# Altium footprint library Miscellaneous Devices.PcbLib: 291 footprints (part 7 of 19)
Each footprint in its own frame and in the unit in brackets; x right, y up, seen from the top. Pads: shape width x height; smd on the part's side, far side on the other; paste and mask are expansions set on the pad; w line width, h text height; cw(c..) or ccw(c..) is an arc to the next point about the centre after c.
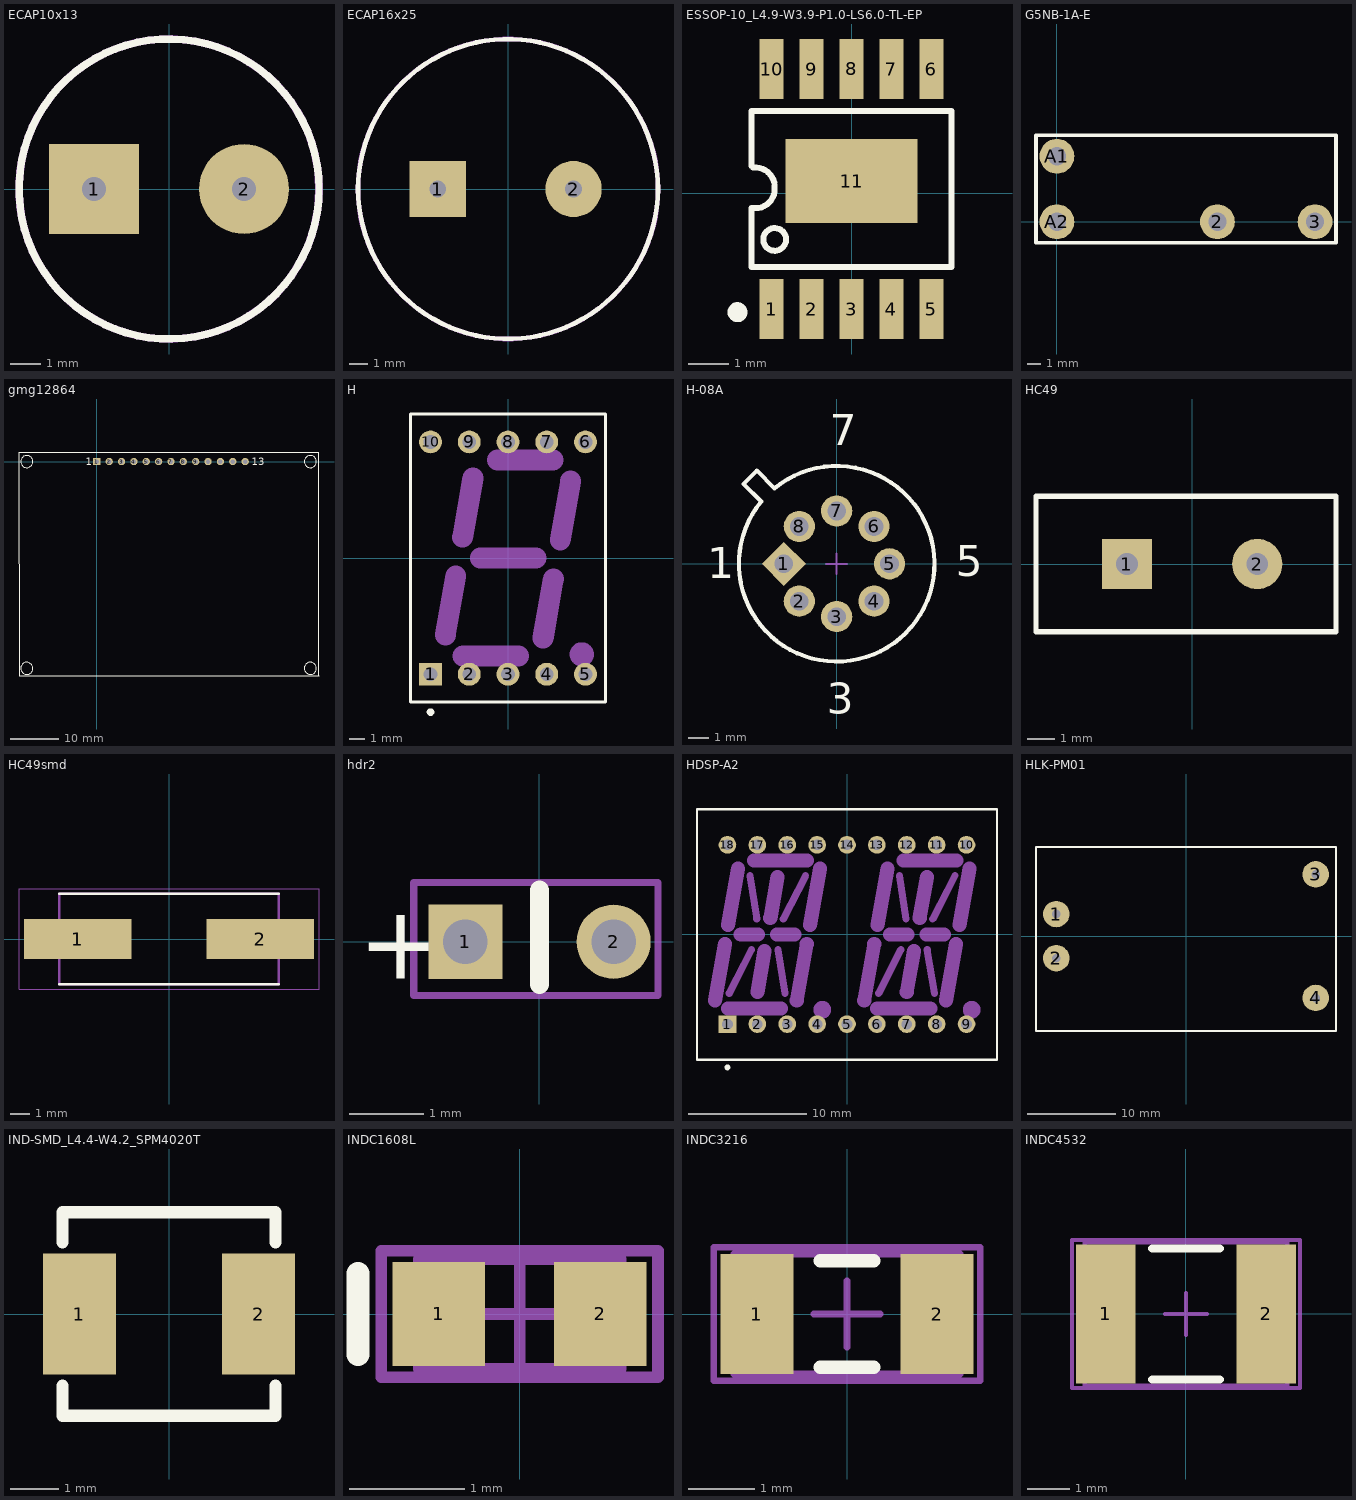
[diagram p6: the footprints below, top view; thin cyan lines are the x and y axes]

## ECAP10x13 [mm] "Capacitor (Radial); 2 Leads"
height 13
pads (2):
  rect 3x3 hole 0.8: 1(-2.5,0)
  round 3 hole 0.8: 2(2.5,0)
Top Overlay:
  circle w0.25: c0,0 r5
Mechanical 15:
  circle w0.254: c0,0 r5
3D body "User Library-Cap-EL(10x13-5).STEP": height 13, standoff -3.3, extent -5,-4.897 5.002,5.098

## ECAP16x25 [mm] "Capacitor (Radial); 2 Leads"
height 25
pads (2):
  rect 3x3 hole 0.9: 1(-3.75,0)
  round 3 hole 0.9: 2(3.5,0)
Top Overlay:
  circle w0.25: c0,0 r8
Mechanical 15:
  circle w0.254: c0,0 r8.004
3D body "User Library-CE_R300_D650_H1000.STEP": height 26.2, standoff -2.7, extent -8.25,-8.25 8.25,8.25

## ESSOP-10_L4.9-W3.9-P1.0-LS6.0-TL-EP [mm]
pads (11):
  rect 0.6x1.5 smd paste+0 mask+0.05: 1(-2,-2.895) 2(-1,-2.895) 3(0,-2.895) 4(1,-2.895) 5(2,-2.895) 6(2,3.105) 7(1,3.105) 8(0,3.105) 9(-1,3.105) 10(-2,3.105)
  rect 3.3x2.1 smd paste+0 mask+0.05: 11(0,0.305)
Top Overlay:
  circle w0.25: c-2.85,-2.975 r0.125
  circle w0.15: c-1.92,-1.155 r0.284
  lines w0.15: -2.5,-1.845 2.5,-1.845 2.5,2.055 -2.5,2.055 -2.5,0.925 -2.5,0.685 -2.46,0.645 cw(c-2.416,0.149) -1.92,0.105 cw(c-2.4,0.105) -2.4,-0.375 -2.5,-0.375 -2.5,-1.845
3D body "User Library-ESSOP10.STEP": height 1.4, standoff 0, extent -2.45,-2.98 2.45,3.175

## G5NB-1A-E [mm] "G5NB-1A-E"
pads (4):
  round 2.5 hole 1.3: 2(11.5,0) 3(18.5,0) A1(0,4.7) A2(0,0)
Top Overlay:
  lines w0.254: -1.5,-1.5 -1.5,6.2 20,6.2 20,-1.5 -1.5,-1.5
3D body "User Library-OMRON G5NB-1A-E 5VDC.STEP": height 16.55, standoff -3.4, extent -1.05,-1.3 19.45,5.9

## gmg12864 [mm] "gmg12864 Module 62mm x 46mm"
pads (13):
  rect 1.5x1.5 hole 0.9: 1(0,0)
  round 1.5 hole 0.9: 2(2.54,0) 3(5.08,0) 4(7.62,0) 5(10.16,0) 6(12.7,0) 7(15.24,0) 8(17.78,0) 9(20.32,0) 10(22.86,0) 11(25.4,0) 12(27.94,0) 13(30.48,0)
Top Overlay:
  circle w0.254: c43.89,-42.5 r1.25
  circle w0.254: c-14.41,0 r1.25
  circle w0.254: c43.89,0 r1.25
  circle w0.254: c-14.41,-42.5 r1.25
  lines w0.254: 45.663,-44 -16,-44 -16,1.9 45.663,1.9 45.663,-43.952
  text "13" at 31.857,-0.762 h1.52
  text "1" at -2.254,-0.762 h1.52
3D body "User Library-GMG12864-06D.STEP": height 20.8, standoff 13.5, extent -16,-43.9 45.8,1.9

## H [mm] "LED, 7-Segment Display, 14.2 mm, RHD; 10 Leads; Row Space 15.24 mm; Pitch 2.54 mm"
height 8.25
pads (10):
  rect 1.5x1.5 hole 0.9: 1(-5.08,-7.62)
  round 1.5 hole 0.9: 2(-2.54,-7.62) 3(0,-7.62) 4(2.54,-7.62) 5(5.08,-7.62) 6(5.08,7.62) 7(2.54,7.62) 8(0,7.62) 9(-2.54,7.62) 10(-5.08,7.62)
Top Overlay:
  circle w0.25: c-5.08,-10.1 r0.125
  lines w0.2: -6.4,-9.45 -6.4,9.45 6.4,9.45 6.4,-9.45 -6.4,-9.45
Mechanical 1:
  circle w1: c4.842,-6.316 r0.296
  lines w1.37: -4.108,-5.054 -3.425,-1.17 ; -2.974,1.368 -2.293,5.255 ; -2.958,-6.429 0.692,-6.426 ; -1.821,0 1.828,0 ; -0.689,6.425 2.96,6.425 ; 2.295,-5.256 2.98,-1.371 ; 3.427,1.169 4.11,5.058
Mechanical 13:
  lines w0.1: -6.4,-9.45 6.4,-9.45 6.4,9.45 -6.4,9.45 -6.4,-9.45
3D body: height 8.25, standoff 0, extent -6.4,-9.45 6.4,9.45

## H-08A [mm] "Can; 8 Leads; Pin Circle Dia. 5.08 mm; Lead Dia. 0.53 mm (max)"
height 4.7
pads (8):
  rect 1.5x1.5 hole 0.9 rot 45: 1(-2.54,0)
  round 1.5 hole 0.9: 2(-1.796,-1.796) 3(0,-2.54) 4(1.796,-1.796) 5(2.54,0) 6(1.796,1.796) 7(0,2.54) 8(-1.796,1.796)
Top Overlay:
  lines w0.2: -4.475,3.838 -3.626,2.99 ccw(c0,0) -2.99,3.626 -3.838,4.475 -4.475,3.838
  text "7" at -0.332,5.7 h1.5
  text "5" at 5.712,-0.589 h1.5
  text "3" at -0.469,-7.22 h1.5
  text "1" at -6.22,-0.696 h1.5
Mechanical 15:
  lines w0.1: -0.5,0 0.5,0 ; 0,-0.5 0,0.5

## HC49 [mm] "Qartz"
pads (2):
  rect 1.85x1.85 hole 0.8: 1(-2.4,0)
  round 1.85 hole 0.8: 2(2.4,0)
Top Overlay:
  lines w0.2: -5.75,-2.5 -5.75,2.5 5.3,2.5 5.3,-2.5 -5.75,-2.5
3D body "User Library-HC49U.STEP": height 13.49, standoff -1.97, extent -5.811,-2.35 5.361,2.322

## HC49smd [mm] "HC49 smd"
height 4.2
pads (2):
  rect 5.6x2.1 smd: 1(-4.75,0) 2(4.75,0)
Top Overlay:
  lines w0.127: -5.7,-2.35 5.7,-2.35 ; -5.7,2.35 5.7,2.35
Mechanical 13:
  lines w0.127: -5.7,-2.35 5.7,-2.35 5.7,2.35 -5.7,2.35 -5.7,-2.35
Mechanical 15:
  lines w0.05: -7.8,-2.6 7.8,-2.6 7.8,2.6 -7.8,2.6 -7.8,-2.6
3D body "User Library-HC49-SMD.STEP": height 5.1, standoff 0, extent -7.4,-2.25 7.6,2.25

## hdr2 [mm] "hdr2"
pads (2):
  rect 1x1 hole 0.6: 1(-1,0)
  round 1 hole 0.6: 2(1,0)
Top Overlay:
  lines w0.254: 0,-0.575 0,0.7
  text "+" at -2.45,-0.5 h1
Mechanical 15:
  lines w0.1: -1.7,-0.725 1.6,-0.725 1.6,0.8 -1.7,0.8 -1.7,-0.725

## HDSP-A2 [mm] "LED, Alphanumeric Display, 13.8 mm, Dual Character; 18 Leads; Row Space 15.24 mm; Pitch 2.54 mm"
height 7.27
pads (18):
  rect 1.5x1.5 hole 0.9: 1(-10.16,-7.62)
  round 1.5 hole 0.9: 2(-7.62,-7.62) 3(-5.08,-7.62) 4(-2.54,-7.62) 5(0,-7.62) 6(2.54,-7.62) 7(5.08,-7.62) 8(7.62,-7.62) 9(10.16,-7.62) 10(10.16,7.62) 11(7.62,7.62) 12(5.08,7.62) 13(2.54,7.62) 14(0,7.62) 15(-2.54,7.62) 16(-5.08,7.62) 17(-7.62,7.62) 18(-10.16,7.62)
Top Overlay:
  circle w0.25: c-10.16,-11.3 r0.125
  lines w0.2: -12.75,-10.65 12.75,-10.65 12.75,10.65 -12.75,10.65 -12.75,-10.65
Mechanical 1:
  circle w1.2: c-2.1,-6.4 r0.15
  circle w1.2: c10.6,-6.4 r0.15
  lines w0.6: -10.01,-5 -8.12,-1.3 ; -8.25,5 -7.67,1.3 ; -5.88,-1.3 -5.28,-5 ; -5.42,1.3 -3.52,5 ; 2.69,-5 4.58,-1.3 ; 4.45,5 5.03,1.3 ; 6.82,-1.3 7.42,-5 ; 7.28,1.3 9.18,5
  lines w1.2: -11.23,-5.6 -10.38,-0.8 ; -10.13,-6.3 -5.62,-6.3 ; -10.1,0.8 -9.26,5.58 ; -9.035,0 -7.58,0 ; -7.9,6.3 -3.39,6.3 ; -7.62,-4.89 -7.01,-1.4 ; -6.52,1.41 -5.91,4.89 ; -5.96,0 -4.465,0 ; -4.27,-5.6 -3.42,-0.8 ; -3.13,0.81 -2.3,5.59 ; 1.47,-5.6 2.32,-0.8 ; 2.57,-6.3 7.08,-6.3 ; 2.6,0.8 3.44,5.58 ; 3.665,0 5.14,0 ; 4.8,6.3 9.31,6.3 ; 5.08,-4.89 5.69,-1.4 ; 6.18,1.41 6.79,4.89 ; 6.76,0 8.235,0 ; 8.43,-5.6 9.28,-0.8 ; 9.57,0.81 10.4,5.59
Mechanical 13:
  lines w0.1: -12.75,-10.65 -12.75,10.65 12.75,10.65 12.75,-10.65 -12.75,-10.65
3D body: height 7.27, standoff 0, extent -12.75,-10.65 12.75,10.65

## HLK-PM01 [mm]
height 15
pads (4):
  round 3 hole 1: 1(-14.7,2.5) 2(-14.7,-2.5) 3(14.7,7) 4(14.7,-7)
Top Overlay:
  lines w0.254: -17,-10.75 -17,-10.25 -17,10.1 17,10.1 17,9.2 17,-10.75 -17,-10.75
3D body: height 15, standoff 0, extent -17,-10.75 17,10.1

## IND-SMD_L4.4-W4.2_SPM4020T [mm]
pads (2):
  rect 1.5x2.5 smd paste+0 mask+0.051: 1(-1.85,0) 2(1.85,0)
Top Overlay:
  lines w0.254: -2.2,-1.481 -2.2,-2.1 2.2,-2.1 2.2,-1.481 ; -2.2,1.481 -2.2,2.1 2.2,2.1 2.2,1.481

## INDC1608L [mm] "Chip Inductor, Body 1.6x0.8mm, IPC High Density"
height 0.55
pads (2):
  rect 0.8x0.9 smd: 1(-0.7,0) 2(0.7,0)
Top Overlay:
  lines w0.2: -1.4,-0.35 -1.4,0.35
Mechanical 13:
  lines w0.1: -0.875,-0.475 -0.875,0.475 0.875,0.475 0.875,-0.475 -0.875,-0.475
Mechanical 15:
  lines w0.1: -0.475,0 0.475,0 ; 0,-0.475 0,0.475 ; -1.2,-0.55 -1.2,0.55 1.2,0.55 1.2,-0.55 -1.2,-0.55
3D body: height 0.55, standoff 0, extent -0.875,-0.475 0.875,0.475

## INDC3216 [mm] "Chip Inductor, Body 3.2x1.6mm, IPC High Density"
height 0.55
pads (2):
  rect 1.1x1.8 smd: 1(-1.35,0) 2(1.35,0)
Top Overlay:
  lines w0.2: -0.4,-0.8 0.4,-0.8 ; -0.4,0.8 0.4,0.8
Mechanical 13:
  lines w0.1: -1.7,-0.9 1.7,-0.9 1.7,0.9 -1.7,0.9 -1.7,-0.9
Mechanical 15:
  lines w0.1: -0.5,0 0.5,0 ; 0,-0.5 0,0.5 ; -2,-1 2,-1 2,1 -2,1 -2,-1
3D body: height 0.55, standoff 0, extent -1.7,-0.9 1.7,0.9

## INDC4532 [mm] "Chip Inductor, Body 4.5x3.2mm, IPC High Density"
height 0.55
pads (2):
  rect 1.4x3.3 smd: 1(-1.9,0) 2(1.9,0)
Top Overlay:
  lines w0.2: -0.8,-1.55 0.8,-1.55 ; -0.8,1.55 0.8,1.55
Mechanical 13:
  lines w0.1: -2.4,-1.7 -2.4,1.7 2.4,1.7 2.4,-1.7 -2.4,-1.7
Mechanical 15:
  lines w0.1: -0.5,0 0.5,0 ; 0,-0.5 0,0.5 ; -2.7,-1.75 -2.7,1.75 2.7,1.75 2.7,-1.75 -2.7,-1.75
3D body: height 0.55, standoff 0, extent -2.4,-1.7 2.4,1.7